# Altium integrated library main_lib.IntLib: 154 symbols (part 1 of 2)
Pins are listed as number, name and electrical type; pins without a type are passive.

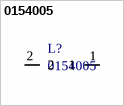
[diagram p0: symbol 0154005]

## 0154005
designator L?
FUSE BRD MNT 5A 125VAC/VDC 2SMD; Precision: 20%; Supplier 1: Digi-Key; Mounted: Yes; Supplier Part Number 1: 308-2498-1-ND; Package / Case: SMD; Current: 5A
footprint Fuse-2-SMD (Metric 2012, EIA 0805. Drawn per Yageo "Chip resistors Mounting" rev 10)
pins: 1, 2


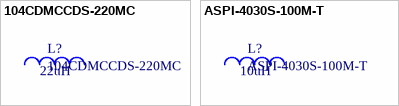
[diagram p1: symbols 104CDMCCDS-220MC to ASPI-4030S-100M-T]

## 104CDMCCDS-220MC
designator L?  value 22uH
FIXED IND 22UH 5A 66 MOHM SMD; Precision: 20%; Supplier 1: Digi-Key; Mounted: Yes; Supplier Part Number 1: 308-2498-1-ND; Package / Case: SMD; Current: 5A
footprint Inductor_22UH 5A
pins: 1, 2

## ASPI-4030S-100M-T
designator L?  value 10uH
10 µH Shielded Drum Core, Wirewound Inductor 1.5 A 100mOhm Nonstandard; Current: 1.5A; Precision: 20%; Supplier 1: Digi-Key; Mounted: Yes; Supplier Part Number 1: 535-12314-2-ND; Package / Case: SMD
footprint INDUCTOR_ASPI-4030S-100M
pins: 1, 2


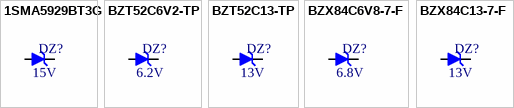
[diagram p2: symbols 1SMA5929BT3G to BZX84C13-7-F]

## 1SMA5929BT3G
designator DZ?  Volt: 15V  (hidden comment: 1SMA5929BT3G)
DIODE ZENER 15V 1.5W SMA; Precision: 5%; Grade: None; Package / Case: DO-214AC, SMA; Supplier 1: Digi-Key; Supplier Part Number 1: 1SMA5929BT3GOSCT-ND; Mounted: Yes; Watt: 1.5W; Supplier Part Number 2: 353-SMAJ5929B-TPCT-ND
footprint SMA/DO-214AC (SMA, DO-214AC. From Diode DS19005 rev 16-2)
pins: 1 A, 2 K

## BZT52C6V2-TP
designator DZ?  Volt: 6.2V  (hidden comment: BZT52C6V2-TP)
Zener Diode 6.2 V 200 mW ±6% Surface Mount SOD-123; Watt: 200mW; Grade: None; Package / Case: SOD-123; Supplier 1: Digi-Key; Supplier Part Number 1: BZT52C13-TPMSCT-ND; Mounted: Yes; Precision: 6%
footprint SOD-123 (SOD-123. From Diodes DDZ6V2B-7 datasheet)
pins: 1 A, 2 K

## BZT52C13-TP
designator DZ?  Volt: 13V  (hidden comment: BZT52C13-TP)
Zener Diode 13 V 200 mW ±6% Surface Mount SOD-123; Watt: 200mW; Grade: None; Package / Case: SOD-123; Supplier 1: Digi-Key; Supplier Part Number 1: BZT52C13-TPMSCT-ND; Mounted: Yes; Precision: 6%
footprint SOD-123 (SOD-123. From Diodes DDZ6V2B-7 datasheet)
pins: 1 A, 2 K

## BZX84C6V8-7-F
designator DZ?  Volt: 6.8V  (hidden comment: BZX84C6V8-7-F)
Zener Diode 6.8 V 300 mW ±6% Surface Mount SOT-23-3; Watt: 300mW; Grade: None; Package / Case: SOT-23-3; Supplier 1: Digi-Key; Supplier Part Number 1: BZX84C6V8-FDICT-ND; Mounted: Yes; Precision: 6%
footprint SOT-23-3 (SOT23-3, from TI DBZ (R-PDSO-G3))
pins: 1 A, 3 K

## BZX84C13-7-F
designator DZ?  Volt: 13V  (hidden comment: BZX84C13-7-F)
Zener Diode 13 V 300 mW ±6% Surface Mount SOT-23-3; Watt: 300mW; Grade: None; Package / Case: SOT-23-3; Supplier 1: Digi-Key; Supplier Part Number 1: BZX84C13-FDICT-ND; Mounted: Yes; Precision: 6%
footprint SOT-23-3 (SOT23-3, from TI DBZ (R-PDSO-G3))
pins: 1 A, 3 K


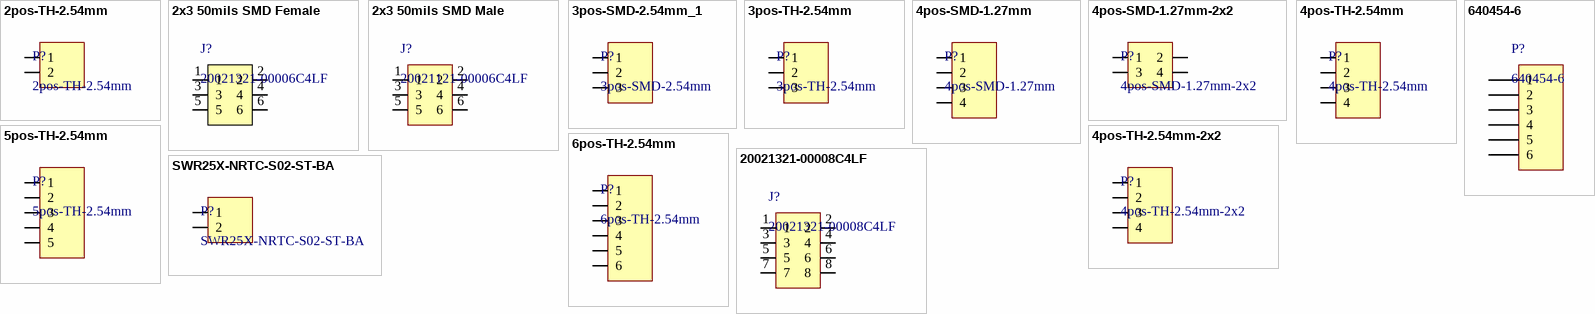
[diagram p3: symbols 2pos-TH-2.54mm to SWR25X-NRTC-S02-ST-BA]

## 2pos-TH-2.54mm
designator P?
2pos TH 2.54mm Header; Supplier 1: Digi-Key; Supplier Part Number 1: N/A; Mounted: Yes; Package / Case: TH; Volt: N/A
footprint HDR1X2 (Connector; Header; 2 Position)
pins: 1, 2

## 2x3 50mils SMD Female
designator J?, comment 20021321-00006C4LF
Minitek127, Board to Board connectors, PCB mounted Receptacle, Vertical, Surface Mount, Double Row, 6 Positions, 1.27mm (0.05inch) pitch; MF: AMPHENOL ICC / FCI; Package: None; Price: None; Check_prices: https://www.snapeda.com/parts/20021321-00006C4LF/Amphenol/view-part/?ref=eda; Value: *; SnapEDA_Link: https://www.snapeda.com/parts/20021321-00006C4LF/Amphenol/view-part/?ref=snap; MP: 20021321-00006C4LF; Availability: In Stock; Purchase-URL: https://pricing.snapeda.com/search?q=20021321-00006C4LF&ref=eda; Supplier 1: Digikey; Supplier Part Number 1: 609-3704-2-ND
footprint AMPHENOL_20021321-00006C4LF
pins: 1, 2, 3, 4, 5, 6

## 2x3 50mils SMD Male
designator J?, comment 20021121-00006C4LF
Minitek127, Board to Board connector, Unshrouded vertical header, Surface Mount, Double Row, 6Positions, 1.27mm (0.5inch) pitch.; MF: AMPHENOL ICC / FCI; Package: None; Price: None; Check_prices: https://www.snapeda.com/parts/20021121-00006C4LF/Amphenol/view-part/?ref=eda; Value: *; SnapEDA_Link: https://www.snapeda.com/parts/20021121-00006C4LF/Amphenol/view-part/?ref=snap; MP: 20021121-00006C4LF; Availability: In Stock; Purchase-URL: https://pricing.snapeda.com/search?q=20021121-00006C4LF&ref=eda; Supplier 1: Digikey; Supplier Part Number 1: 609-3693-2-ND
footprint AMPHENOL_20021121-00006C4LF
pins: 1, 2, 3, 4, 5, 6

## 3pos-SMD-2.54mm_1
designator P?, comment 3pos-SMD-2.54mm
3pos SMD 2.54mm Header; Supplier 1: Digi-Key; Supplier Part Number 1: N/A; Mounted: Yes; Package / Case: SMD; Volt: N/A
footprint HDR1X3 - PAD (Connector; Header; 2 Position)
pins: 1, 2, 3

## 3pos-TH-2.54mm
designator P?
3pos TH 2.54mm Header; Supplier 1: Digi-Key; Supplier Part Number 1: N/A; Mounted: Yes; Package / Case: TH; Volt: N/A
footprint HDR1X3 (Connector; Header; 2 Position)
pins: 1, 2, 3

## 4pos-SMD-1.27mm
designator P?
4pos SMD 1.27mm; Supplier 1: Digi-Key; Supplier Part Number 1: N/A; Mounted: Yes; Package / Case: TH; Volt: N/A
footprint HDR1X4-SMD-50mils (Connector; Header; 4 Positions 50mils)
pins: 1, 2, 3, 4

## 4pos-SMD-1.27mm-2x2
designator P?
4pos SMD 1.27mm; Supplier 1: Digi-Key; Supplier Part Number 1: S9012E-02-ND; Mounted: Yes; Package / Case: TH; Volt: N/A
footprint HDR2X2-SMD-50mils (Connector; Header; 2 Position)
pins: 1, 2, 3, 4

## 4pos-TH-2.54mm
designator P?
4pos TH 2.54mm Header; Supplier 1: Digi-Key; Supplier Part Number 1: N/A; Mounted: Yes; Package / Case: TH; Volt: N/A
footprint HDR1X4 (Connector; Header; 2 Position)
footprint HDR1X4-W (Connector; Header; 2 Position)
footprint HDR1X4-SMD (Connector; Header; 2 Position)
pins: 1, 2, 3, 4

## 4pos-TH-2.54mm-2x2
designator P?
4pos TH 2.54mm Header-2x2; Supplier 1: Digi-Key; Supplier Part Number 1: N/A; Mounted: Yes; Package / Case: TH; Volt: N/A
footprint HDR2X2 (Connector; Header; 2 Position)
pins: 1, 2, 3, 4

## 5pos-TH-2.54mm
designator P?
5pos TH 2.54mm Header; Supplier 1: Digi-Key; Supplier Part Number 1: N/A; Mounted: Yes; Package / Case: TH; Volt: N/A
footprint HDR1X5 (Connector; Header; 2 Position)
pins: 1, 2, 3, 4, 5

## 6pos-TH-2.54mm
designator P?
6pos TH 2.54mm Header; Supplier 1: Digi-Key; Supplier Part Number 1: N/A; Mounted: Yes; Package / Case: TH; Volt: N/A
footprint HDR1X6 (Connector; Header; 2 Position)
pins: 1, 2, 3, 4, 5, 6

## 640454-6
designator P?
CONN HEADER VERT 6POS .100 TIN; Manufacturer: TE Connectivity AMP Connectors; Connector Type: Header, Unshrouded; Pitch: 0.100" (2.54mm); Number of Positions: 6; Number of Positions Loaded: All; Supplier 1: Digi-Key; Supplier Part Number 1: A19433-ND; Category: Connectors, Interconnects; Packaging: Bulk; Part Status: Active; Contact Type: Male Pin; Number of Rows: 1; Row Spacing: -; Mounting Type: Through Hole; Termination: Solder; Fastening Type: -; Contact Mating Length: 0.295" (7.49mm); Features: Polarizing Key; Contact Finish: Tin; Contact Finish Thickness: -; Color: Natural; ComponentLink1URL: http://www.te.com/commerce/DocumentDelivery/DDEController?Action=srchrtrv&DocNm=640454&DocType=Customer+Drawing&DocLang=English; ComponentLink1Description: http://www.te.com/commerce/DocumentDelivery/DDEController?Action=srchrtrv&DocNm=640454&DocType=Customer+Drawing&DocLang=English; Manufacturer Part Number: 640454-6
footprint 640454-6 (CONN HEADER MTA-100 VERT 6POS .100)
pins: 1, 2, 3, 4, 5, 6

## 20021321-00008C4LF
designator J?
2x4 header 50mils SMD; Mfr_Name: Amphenol ICC; Copyright: Copyright (C) 2023 Ultra Librarian. All rights reserved.; Manufacturer_Part_Number: 20021321-00008C4LF; RefDes: RefDes; Type: DEV; Supplier 1: Digikey; Supplier Part Number 1: 609-3705-2-ND
footprint CONN_20021321-00008C4LF_AMP
pins: 1, 2, 3, 4, 5, 6, 7, 8

## SWR25X-NRTC-S02-ST-BA
designator P?
2pos TH 2.54mm Header; Supplier 1: Digi-Key; Supplier Part Number 1: N/A; Mounted: Yes; Package / Case: TH; Volt: N/A
footprint SWR25X-NRTC-S02-ST-BA (Connector; Header; 2 Position)
pins: 1, 2


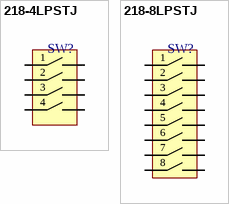
[diagram p4: symbols 218-4LPSTJ to 218-8LPSTJ]

## 218-4LPSTJ
designator SW?  (value not drawn)
SWITCH SLIDE DIP SPST 25MA 24V; Mounted: Yes; Package / Case: 6.25 x 6.05mm; Supplier 1: Digi-Key; Supplier Part Number 1: CT3109-ND; Current: 25mA; Volt: 24V
footprint DIPSWITCH-218LPJ-4 (DIP Switch for CTS 218LPJ serie, 4 swtiches 8 pins.)
pins: 1, 2, 3, 4, 5, 6, 7, 8

## 218-8LPSTJ
designator SW?  (value not drawn)
SWITCH SLIDE DIP SPST 25MA 24V; Mounted: Yes; Package / Case: 11.3 x 6.05mm; Supplier 1: Digi-Key; Supplier Part Number 1: CT3111-ND; Current: 25mA; Volt: 24V
footprint DIPSWITCH-218LPJ-8 (DIP Switch for CTS 218LPJ serie, 8 swtiches 16 pins.)
pins: 1, 2, 3, 4, 5, 6, 7, 8, 9, 10, 11, 12, 13, 14, 15, 16


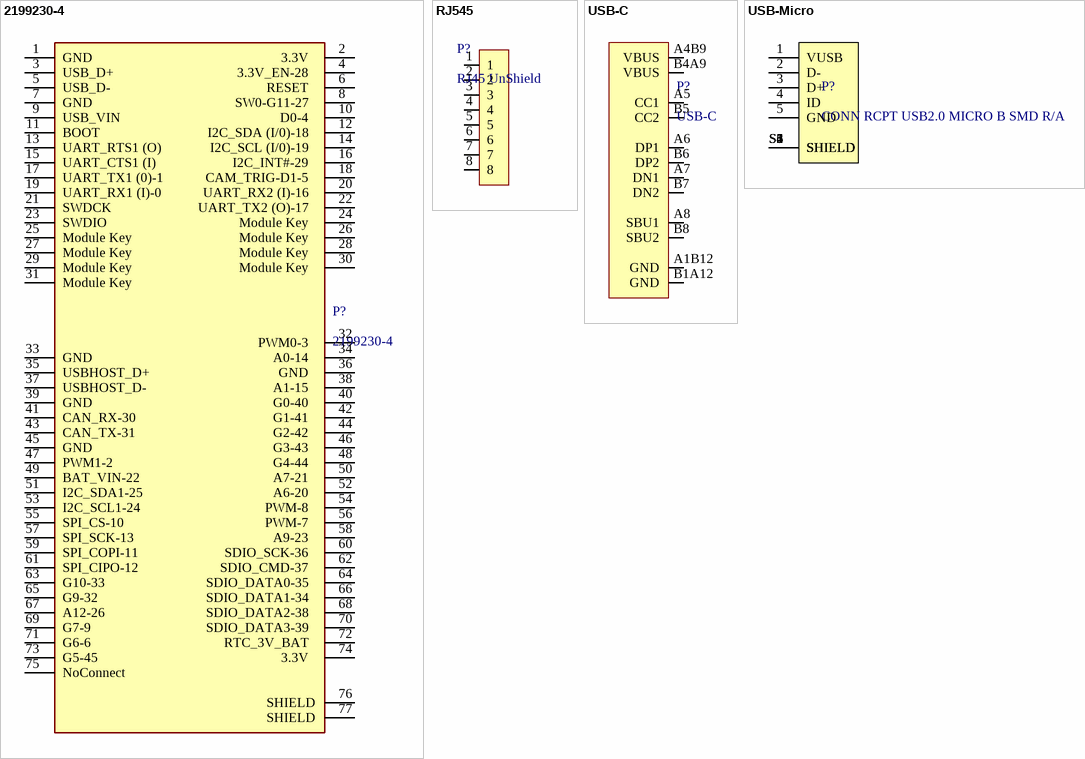
[diagram p5: symbols 2199230-4 to USB-Micro]

## 2199230-4
designator P?
CONN M.2 FMALE 67POS 0.020 GOLD / Représentant le MicroMod Teensy; Supplier 1: Digi-Key; Supplier Part Number 1: A115904TR-ND; Mounted: Yes; Package / Case: TH; Volt: N/A
footprint CONN67_2199230_TEC
pins: 1 GND, 2 3.3V  , 3 USB_D+  , 4 3.3V_EN-28  , 5 USB_D-  , 6 RESET  , 7 GND  , 8 SW0-G11-27  , 9 USB_VIN  , 10 D0-4  , 11 BOOT  , 12 I2C_SDA (I/0)-18  , 13 UART_RTS1 (O)  , 14 I2C_SCL (I/0)-19  , 15 UART_CTS1 (I)  , 16 I2C_INT#-29  , 17 UART_TX1 (0)-1  , 18 CAM_TRIG-D1-5  , 19 UART_RX1 (I)-0  , 20 UART_RX2 (I)-16  , 21 SWDCK  , 22 UART_TX2 (O)-17  , 23 SWDIO  , 24 Module Key  , 25 Module Key  , 26 Module Key  , 27 Module Key  , 28 Module Key  , 29 Module Key  , 30 Module Key  , 31 Module Key  , 32 PWM0-3  , 33 GND, 34 A0-14  , 35 USBHOST_D+  , 36 GND  , 37 USBHOST_D-  , 38 A1-15  , 39 GND  , 40 G0-40  , 41 CAN_RX-30  , 42 G1-41  , 43 CAN_TX-31  , 44 G2-42  , 45 GND  , 46 G3-43  , 47 PWM1-2  , 48 G4-44  , 49 BAT_VIN-22  , 50 A7-21  , 51 I2C_SDA1-25  , 52 A6-20  , 53 I2C_SCL1-24  , 54 PWM-8  , 55 SPI_CS-10  , 56 PWM-7  , 57 SPI_SCK-13  , 58 A9-23  , 59 SPI_COPI-11  , 60 SDIO_SCK-36  , 61 SPI_CIPO-12  , 62 SDIO_CMD-37  , 63 G10-33  , 64 SDIO_DATA0-35  , 65 G9-32  , 66 SDIO_DATA1-34  , 67 A12-26  , 68 SDIO_DATA2-38  , 69 G7-9  , 70 SDIO_DATA3-39  , 71 G6-6  , 72 RTC_3V_BAT  , 73 G5-45  , 74 3.3V  , 75 NoConnect, 76 SHIELD, 77 SHIELD

## RJ545
designator P?, comment RJ45 UnShield
Jack Modular Connector 8p8c (RJ45, Ethernet) 90° Angle (Right) Unshielded Cat3; Supplier 1: Digikey; Supplier Part Number 1: 609-4616-2-ND; Mounted: Yes; Package / Case: SMD; Volt: N/A
footprint AMPHENOL_54602-908LF (RJ45)
pins: 1, 2, 3, 4, 5, 6, 7, 8

## USB-C
designator P?
TYPEC-304J-BCP16 / 5A USB 3.1 1 Type-C SMD USB Connectors; Supplier 1: LCSC; Supplier Part Number 1: TYPEC-304J-BCP16; Mounted: Yes; Package / Case: SMD; Volt: N/A
footprint USB-C
pins: A1B12 GND, A4B9 VBUS, A5 CC1, A6 DP1, A7 DN1, A8 SBU1, B1A12 GND, B4A9 VBUS, B5 CC2, B6 DP2, B7 DN2, B8 SBU2

## USB-Micro
designator P?, comment CONN RCPT USB2.0 MICRO B SMD R/A
USB - micro B USB 2.0 Receptacle Connector 5 Position Surface Mount, Right Angle; Through Hole; Supplier 1: Digikey; Supplier Part Number 1: 609-4616-2-ND; Mounted: Yes; Package / Case: SMD; Volt: N/A
footprint FCI_10118193-0001LF
pins: 1 VUSB, 2 D-, 3 D+, 4 ID, 5 GND, S1 SHIELD, S2 SHIELD, S3 SHIELD, S4 SHIELD, S5 SHIELD, S6 SHIELD


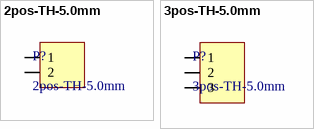
[diagram p6: symbols 2pos-TH-5.0mm to 3pos-TH-5.0mm]

## 2pos-TH-5.0mm
designator P?
2pos-TH-5.0mm Screw Terminal; Supplier 1: Digi-Key; Supplier Part Number 1: N/A277-1667-ND; Mounted: Yes; Package / Case: TH; Volt: N/A
footprint Weco 2
pins: 1, 2

## 3pos-TH-5.0mm
designator P?
3pos-TH-5.0mm Screw Terminal; Supplier 1: Digi-Key; Supplier Part Number 1: 277-1667-ND; Mounted: Yes; Package / Case: TH; Volt: N/A
footprint Weco 3
pins: 1, 2, 3


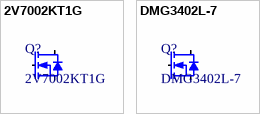
[diagram p7: symbols 2V7002KT1G to DMG3402L-7]

## 2V7002KT1G
designator Q?
MOSFET N-CH 60V 320MA SOT-23-3; Supplier 1: Digi-Key; Supplier Part Number 1: 2V7002KT1GOSCT-ND; Volt: 60V; Package / Case: SOT-23-3; Mounted: Yes
footprint SOT-23-3 (SOT23-6, from TI DBZ (R-PDSO-G3))
pins: 1 G, 2 S, 3 D

## DMG3402L-7
designator Q?
N-Channel 30 V 4A (Ta) 1.4W (Ta) Surface Mount SOT-23-3; Volt: 30V; Supplier 1: Digi-Key; Supplier Part Number 1: DMG3402L-7DICT-ND; Package / Case: SOT-23-3; Mounted: Yes; Current: 4A
footprint SOT-23-3 (SOT23-6, from TI DBZ (R-PDSO-G3))
pins: 1 G, 2 S, 3 D


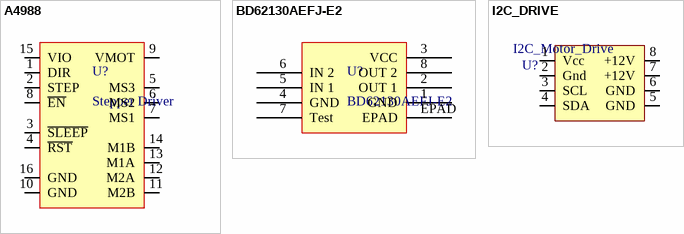
[diagram p8: symbols A4988 to I2C_DRIVE]

## A4988
designator U?, comment Stepper Driver
Stepper Driver PCB; Supplier 1: Digi-Key; Package / Case: Custom; Mounted: Yes
footprint A4899 (Connector; Header; 2 Position)
pins: 1 DIR, 2 STEP, 3 ~{SLEEP}, 4 ~{RST}, 5 MS3, 6 MS2, 7 MS1, 8 ~{EN}, 9 VMOT, 10 GND, 11 M2B, 12 M2A, 13 M1A, 14 M1B, 15 VIO, 16 GND

## BD62130AEFJ-E2
designator U?
1 CHANNEL H BRIDGE Motor. 28V, 3A; Supplier 1: Digi-Key; Supplier Part Number 1: BD62130AEFJ-E2CT-ND; Package / Case: 8-HTSOP-J; Mounted: Yes
footprint P-HSOP8
pins: 1 GND, 2 OUT 1, 3 VCC, 4 GND, 5 IN 1, 6 IN 2, 7 Test, 8 OUT 2, EPAD

## I2C_DRIVE
designator U?, comment I2C_Motor_Drive
Schematic for I2C_Drive made by Emile Renaud; Precision: 1%; Watt: 0.1W; Mounted: Yes; Package / Case: Metric 1608, EIA 0603
footprint I2C_Drive_SMD (Custom E.R I2C Motor Driver)
footprint I2C_Drive_TH (Custom E.R I2C Motor Driver)
pins: 1 Vcc, 2 Gnd, 3 SCL, 4 SDA, 5 GND, 6 GND, 7 +12V, 8 +12V


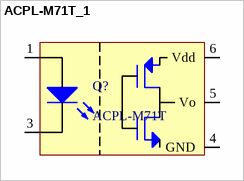
[diagram p9: symbol ACPL-M71T_1]

## ACPL-M71T_1
designator Q?, comment ACPL-M71T
OPTOISO 4KV PUSH PULL 5SOIC; Supplier 1: Digi-Key; Supplier Part Number 1: 516-4134-1-ND; Package / Case: 5-SOIC; Mounted: Yes
footprint SOIC-6, 5 Leads (6-SOIC (0.173", 4.40mm Width), 5 Leads, JEDEC MO-155 Package)
pins: 1 Anode, 3 Cathode, 4 GND, 5 Vo, 6 Vdd


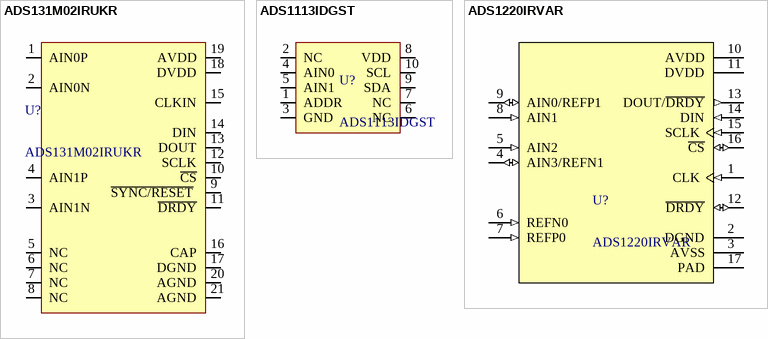
[diagram p10: symbols ADS131M02IRUKR to ADS1220IRVAR]

## ADS131M02IRUKR
designator U?
24 Bit Analog to Digital Converter 2 Input 2 Sigma-Delta 20-WQFN (3x3); Precision: N/A; Package / Case: 20-WQFN; Mounted: Yes; Supplier 1: Digi-Key; Supplier Part Number 1: 296-ADS131M02IRUKRTR-ND; Supplier 2: Digi-Key; Supplier 3: Digi-Key; Supplier 4: Digi-Key
footprint WQFN-20 (20-WQFN (3x3))
pins: 1 AIN0P, 2 AIN0N, 3 AIN1N, 4 AIN1P, 5 NC, 6 NC, 7 NC, 8 NC, 9 ~{SYNC/RESET} , 10 ~{CS}, 11 ~{DRDY}, 12 SCLK, 13 DOUT, 14 DIN, 15 CLKIN, 16 CAP, 17 DGND, 18 DVDD, 19 AVDD, 20 AGND, 21 AGND

## ADS1113IDGST
designator U?
IC ADC 16BIT SIGMA-DELTA 10VSSOP; Precision: N/A; Package / Case: 10-VSSOP; Mounted: Yes; Supplier 1: Digi-Key; Supplier Part Number 1: 296-24930-1-ND; Supplier 2: Digi-Key; Supplier 3: Digi-Key; Supplier 4: Digi-Key
footprint VSSOP-10 (TI VSSOP-10 DGS0010A 05/2015)
pins: 1 ADDR, 2 NC, 3 GND, 4 AIN0, 5 AIN1, 6 NC, 7 NC, 8 VDD, 9 SDA, 10 SCL

## ADS1220IRVAR
designator U?
IC ADC 24BIT SIGMA-DELTA 16-VFQFN Exposed Pad / 2k sampling rate / second; Precision: N/A; Package / Case: 16-VQFN; Mounted: Yes; Supplier 1: Digi-Key; Supplier Part Number 1: 296-48475-2-ND; Supplier 2: Digi-Key; Supplier 3: Digi-Key; Supplier 4: Digi-Key
footprint VFQFN-16 Pad
pins: 1 CLK (in), 2 DGND (power), 3 AVSS (power), 4 AIN3/REFN1 (io), 5 AIN2 (in), 6 REFN0 (in), 7 REFP0 (in), 8 AIN1 (in), 9 AIN0/REFP1 (io), 10 AVDD (power), 11 DVDD (power), 12 ~{DRDY} (io), 13 DOUT/~{DRDY} (out), 14 DIN (in), 15 SCLK (in), 16 ~{CS} (io), 17 PAD


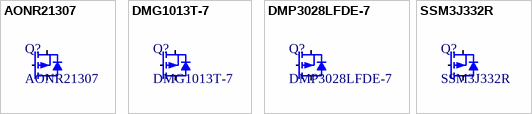
[diagram p11: symbols AONR21307 to SSM3J332R]

## AONR21307
designator Q?
MOSFET P-CH 30V 24A 8DFN; Supplier 1: Digi-Key; Supplier Part Number 1: 785-1796-2-ND; Volt: 30V; Package / Case: 8-DFN-EP (3x3); Mounted: Yes; Current: 24A
footprint DFN8_3x3_EP_AOS
pins: 1 S, 2 S, 3 S, 4 G, 5 D, 6 D, 7 D, 8 D

## DMG1013T-7
designator Q?
MOSFET P-CH 20V 460MA SOT523; Supplier 1: Digi-Key; Supplier Part Number 1: DMG1013T-7DITR-ND; Volt: 20V; Package / Case: SOT-523; Mounted: Yes
footprint SOT-523 (SOT-523 from Diode AP02001)
pins: 1 G, 2 S, 3 D

## DMP3028LFDE-7
designator Q?
MOSFET P-CH 30V 6.8A 6UDFN; Supplier 1: Digi-Key; Supplier Part Number 1: DMP3028LFDE-7; Volt: 30V; Package / Case: 6UDFN; Mounted: Yes; Current: 6.8A
footprint U-DFN2020-6
pins: 1 D, 2 D, 3 G, 4 S, 5 D, 6 D

## SSM3J332R
designator Q?
P-Channel 30 V 6A (Ta) 1W (Ta) Surface Mount SOT-23F; Volt: 30V; Supplier 1: Digi-Key; Supplier Part Number 1: SSM3J332RLFCT-ND; Package / Case: SOT-523; Mounted: Yes; Current: 6A
footprint SOT-23-3 (SOT23-3, from TI DBZ (R-PDSO-G3))
pins: 1 G, 2 S, 3 D


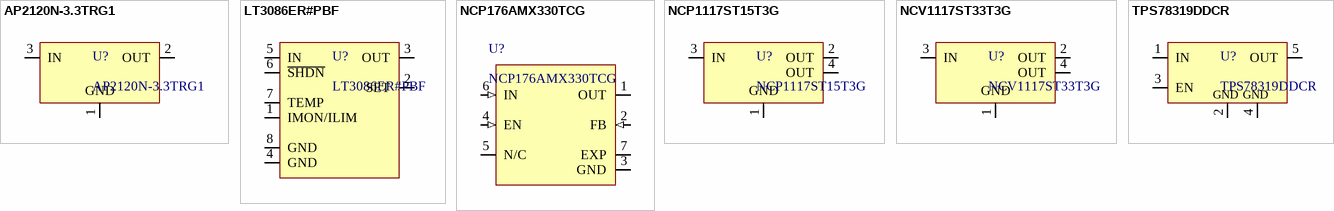
[diagram p12: symbols AP2120N-3.3TRG1 to TPS78319DDCR]

## AP2120N-3.3TRG1
designator U?
IC REG LINEAR 3.3V 150mA SOT23; Supplier 1: Digi-Key; Supplier Part Number 1: AP2120N-3.3TRG1; Package / Case: SOT23; Mounted: Yes
footprint SOT-23-3 (SOT23-3, from TI DBZ (R-PDSO-G3))
pins: 1 GND, 2 OUT, 3 IN

## LT3086ER#PBF
designator U?
IC REG LDO ADJ 2.1A 40V DDPAK; Supplier 1: Digi-Key; Supplier Part Number 1: LT3086ER#PBF-ND; Package / Case: TO-263-8, D²Pak (7 Leads + Tab), TO-263CA; Mounted: Yes
footprint TO-263-8/D2PAK8 (TO-263-8, D²Pak (7 Leads + Tab), TO-263CA. modified from Infineon FLG09089)
pins: 1 IMON/ILIM, 2 SET, 3 OUT, 4 GND, 5 IN, 6 ~{SHDN}, 7 TEMP, 8 GND

## NCP176AMX330TCG
designator U?
IC REG LINEAR 3.3V 500mA 6-XDFN; Supplier 1: Digi-Key; Supplier Part Number 1: NCP176AMX330TCGOSCT-ND; Package / Case: 6-XDFN; Mounted: Yes
footprint XFDFN-6 Exposed Pad
pins: 1 OUT, 2 FB (in), 3 GND (power), 4 EN (in), 5 N/C, 6 IN (in), 7 EXP (power)

## NCP1117ST15T3G
designator U?
IC REG LINEAR 3.3V 1A SOT223; Supplier 1: Digi-Key; Supplier Part Number 1: NCV1117ST33T3GOSCT-ND; Package / Case: SOT223; Mounted: Yes
footprint SOT-223-3/TO-261-3S (TO-261-3 / SOT-223-3 from Infineon IPN80R600P7 Datasheet, rev 2,1)
pins: 1 GND, 2 OUT, 3 IN, 4 OUT

## NCV1117ST33T3G
designator U?
IC REG LINEAR 3.3V 1A SOT223; Supplier 1: Digi-Key; Supplier Part Number 1: NCP1117ST15T3GOSTR-ND; Package / Case: SOT223; Mounted: Yes
footprint SOT-223-3/TO-261-3S (TO-261-3 / SOT-223-3 from Infineon IPN80R600P7 Datasheet, rev 2,1)
pins: 1 GND, 2 OUT, 3 IN, 4 OUT

## TPS78319DDCR
designator U?
IC REG LINEAR 1.9V 150MA SOT23-5; Supplier 1: Digi-Key; Supplier Part Number 1: 296-40965-1-ND; Package / Case: SOT23-5; Mounted: Yes; Help URL: https://www.ti.com/lit/ds/symlink/tps783.pdf?HQS=dis-dk-null-digikeymode-dsf-pf-null-wwe&ts=1700078812445&ref_url=https%253A%252F%252Fwww.ti.com%252Fgeneral%252Fdocs%252Fsuppproductinfo.tsp%253FdistId%253D10%2526gotoUrl%253Dhttps%253A%252F%252Fwww.ti.com%252Flit%252Fgpn%252Ftps783
footprint SOT-23-5 (SOT23-5, from TI DDC (R-PDSO-G6), modified from 6 to 5 pins)
pins: 1 IN, 2 GND, 3 EN, 4 OUT, 5 OUT


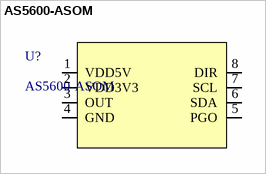
[diagram p13: symbol AS5600-ASOM]

## AS5600-ASOM
designator U?
SENSOR ANGLE 360DEG SMD; Mfr_Name: ams OSRAM; Manufacturer_Part_Number: AS5600L-ASOM; Copyright: Copyright (C) 2023 Ultra Librarian. All rights reserved.; RefDes: RefDes; Type: DEV
footprint AS5600L-ASOM_AMS
pins: 1 VDD5V, 2 VDD3V3, 3 OUT, 4 GND, 5 PGO, 6 SDA, 7 SCL, 8 DIR

